# Altium footprint library pcblib.PcbLib: 92 footprints (part 2 of 6)
Each footprint in its own frame and in the unit in brackets; x right, y up, seen from the top. Pads: shape width x height; smd on the part's side, far side on the other; paste and mask are expansions set on the pad; w line width, h text height; cw(c..) or ccw(c..) is an arc to the next point about the centre after c.
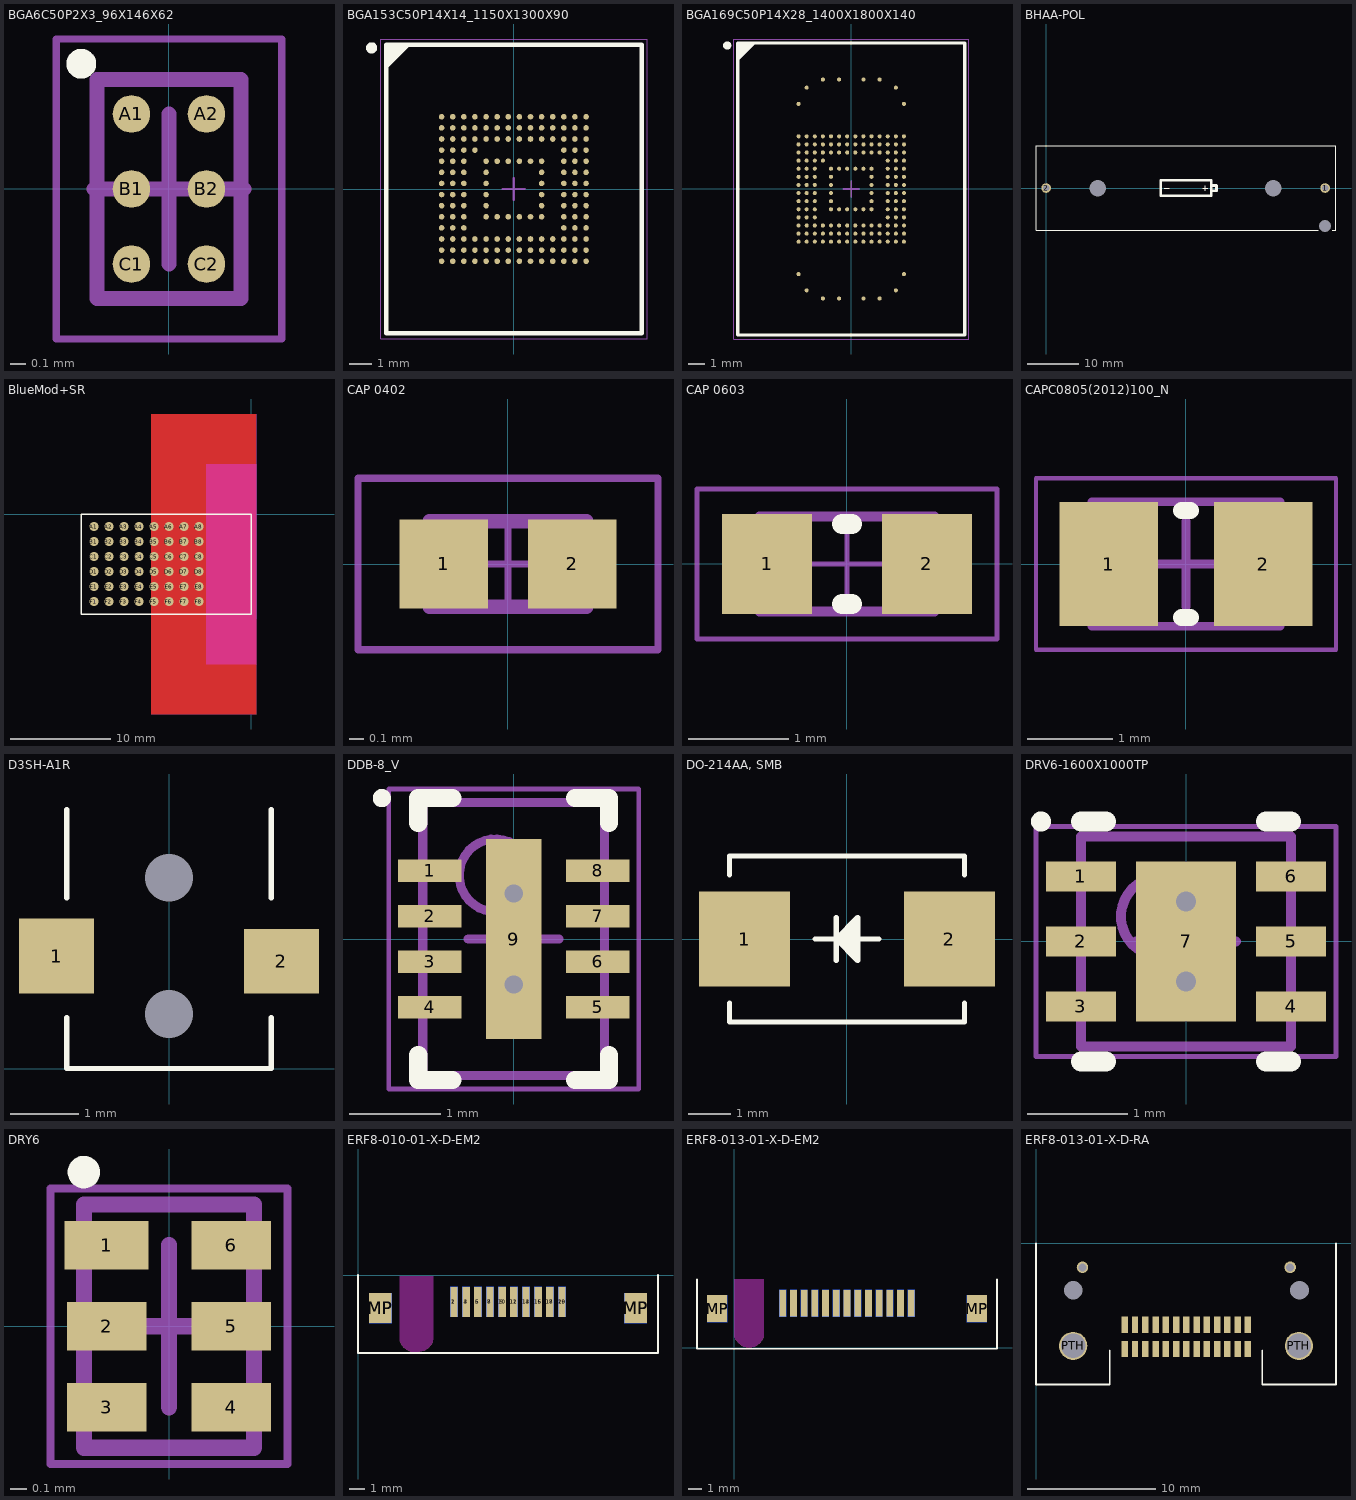
[diagram p1: the footprints below, top view; thin cyan lines are the x and y axes]

## BGA6C50P2X3_96X146X62 [mm] "BGA, 6-Leads, Body 0.96x1.46mmx0.63mm, Pitch 0.50mm"
height 0.63
pads (6):
  round 0.25 smd: A1(-0.25,0.5) A2(0.25,0.5) B1(-0.25,0) B2(0.25,0) C1(-0.25,-0.5) C2(0.25,-0.5)
Top Overlay:
  circle w0.1: c-0.585,0.835 r0.05
Mechanical 13:
  lines w0.1: -0.48,-0.73 0.48,-0.73 0.48,0.73 -0.48,0.73 -0.48,-0.73
Mechanical 15:
  lines w0.05: -0.75,-1 0.75,-1 0.75,1 -0.75,1 -0.75,-1
  lines w0.1: -0.5,0 0.5,0 ; 0,-0.5 0,0.5
3D body: height 0.63, standoff 0.25, extent -0.48,-0.73 0.48,0.73

## BGA153C50P14X14_1150X1300X90 [mm] "BGA, 153-Leads, Body 11.50x13.00mmx0.90mm, Pitch 0.50mm"
height 0.9
pads (153):
  round 0.25 smd: A1(-3.25,3.25) A2(-2.75,3.25) A3(-2.25,3.25) A4(-1.75,3.25) A5(-1.25,3.25) A6(-0.75,3.25) A7(-0.25,3.25) A8(0.25,3.25) A9(0.75,3.25) A10(1.25,3.25) A11(1.75,3.25) A12(2.25,3.25) A13(2.75,3.25) A14(3.25,3.25) B1(-3.25,2.75) B2(-2.75,2.75) B3(-2.25,2.75) B4(-1.75,2.75) B5(-1.25,2.75) B6(-0.75,2.75) B7(-0.25,2.75) B8(0.25,2.75) B9(0.75,2.75) B10(1.25,2.75) B11(1.75,2.75) B12(2.25,2.75) B13(2.75,2.75) B14(3.25,2.75) C1(-3.25,2.25) C2(-2.75,2.25) C3(-2.25,2.25) C4(-1.75,2.25) C5(-1.25,2.25) C6(-0.75,2.25) C7(-0.25,2.25) C8(0.25,2.25) C9(0.75,2.25) C10(1.25,2.25) C11(1.75,2.25) C12(2.25,2.25) C13(2.75,2.25) C14(3.25,2.25) D1(-3.25,1.75) D2(-2.75,1.75) D3(-2.25,1.75) D4(-1.75,1.75) D12(2.25,1.75) D13(2.75,1.75) D14(3.25,1.75) E1(-3.25,1.25) E2(-2.75,1.25) E3(-2.25,1.25) E5(-1.25,1.25) E6(-0.75,1.25) E7(-0.25,1.25) E8(0.25,1.25) E9(0.75,1.25) E10(1.25,1.25) E12(2.25,1.25) E13(2.75,1.25) E14(3.25,1.25) F1(-3.25,0.75) F2(-2.75,0.75) F3(-2.25,0.75) F5(-1.25,0.75) F10(1.25,0.75) F12(2.25,0.75) F13(2.75,0.75) F14(3.25,0.75) G1(-3.25,0.25) G2(-2.75,0.25) G3(-2.25,0.25) G5(-1.25,0.25) G10(1.25,0.25) G12(2.25,0.25) G13(2.75,0.25) G14(3.25,0.25) H1(-3.25,-0.25) H2(-2.75,-0.25) H3(-2.25,-0.25) H5(-1.25,-0.25) H10(1.25,-0.25) H12(2.25,-0.25) H13(2.75,-0.25) H14(3.25,-0.25) J1(-3.25,-0.75) J2(-2.75,-0.75) J3(-2.25,-0.75) J5(-1.25,-0.75) J10(1.25,-0.75) J12(2.25,-0.75) J13(2.75,-0.75) J14(3.25,-0.75) K1(-3.25,-1.25) K2(-2.75,-1.25) K3(-2.25,-1.25) K5(-1.25,-1.25) K6(-0.75,-1.25) K7(-0.25,-1.25) K8(0.25,-1.25) K9(0.75,-1.25) K10(1.25,-1.25) K12(2.25,-1.25) K13(2.75,-1.25) K14(3.25,-1.25) L1(-3.25,-1.75) L2(-2.75,-1.75) L3(-2.25,-1.75) L12(2.25,-1.75) L13(2.75,-1.75) L14(3.25,-1.75) M1(-3.25,-2.25) M2(-2.75,-2.25) M3(-2.25,-2.25) M4(-1.75,-2.25) M5(-1.25,-2.25) M6(-0.75,-2.25) M7(-0.25,-2.25) M8(0.25,-2.25) M9(0.75,-2.25) M10(1.25,-2.25) M11(1.75,-2.25) M12(2.25,-2.25) M13(2.75,-2.25) M14(3.25,-2.25) N1(-3.25,-2.75) N2(-2.75,-2.75) N3(-2.25,-2.75) N4(-1.75,-2.75) N5(-1.25,-2.75) N6(-0.75,-2.75) N7(-0.25,-2.75) N8(0.25,-2.75) N9(0.75,-2.75) N10(1.25,-2.75) N11(1.75,-2.75) N12(2.25,-2.75) N13(2.75,-2.75) N14(3.25,-2.75) P1(-3.25,-3.25) P2(-2.75,-3.25) P3(-2.25,-3.25) P4(-1.75,-3.25) P5(-1.25,-3.25) P6(-0.75,-3.25) P7(-0.25,-3.25) P8(0.25,-3.25) P9(0.75,-3.25) P10(1.25,-3.25) P11(1.75,-3.25) P12(2.25,-3.25) P13(2.75,-3.25) P14(3.25,-3.25)
Top Overlay:
  circle w0.25: c-6.4,6.35 r0.125
  region: -4.75,6.5 -5.75,5.5 -5.75,6.5
  lines w0.2: -5.75,5.5 -4.75,6.5 ; -5.75,-6.5 5.75,-6.5 5.75,6.5 -5.75,6.5 -5.75,-6.5
Mechanical 13:
  lines w0.1: -5.75,-6.5 5.75,-6.5 5.75,6.5 -5.75,6.5 -5.75,-6.5
Mechanical 15:
  lines w0.05: -6,-6.75 6,-6.75 6,6.75 -6,6.75 -6,-6.75
  lines w0.1: -0.5,0 0.5,0 ; 0,-0.5 0,0.5
3D body: height 0.9, standoff 0.22, extent -5.75,-6.5 5.75,6.5

## BGA169C50P14X28_1400X1800X140 [mm] "BGA, 169-Leads, Body 14.00x18.00mmx1.40mm, Pitch 0.50mm"
height 1.4
pads (169):
  round 0.25 smd: A4(-1.75,6.75) A6(-0.75,6.75) A9(0.75,6.75) A11(1.75,6.75) AA1(-3.25,-3.25) AA2(-2.75,-3.25) AA3(-2.25,-3.25) AA4(-1.75,-3.25) AA5(-1.25,-3.25) AA6(-0.75,-3.25) AA7(-0.25,-3.25) AA8(0.25,-3.25) AA9(0.75,-3.25) AA10(1.25,-3.25) AA11(1.75,-3.25) AA12(2.25,-3.25) AA13(2.75,-3.25) AA14(3.25,-3.25) AE1(-3.25,-5.25) AE14(3.25,-5.25) AG2(-2.75,-6.25) AG13(2.75,-6.25) AH4(-1.75,-6.75) AH6(-0.75,-6.75) AH9(0.75,-6.75) AH11(1.75,-6.75) B2(-2.75,6.25) B13(2.75,6.25) D1(-3.25,5.25) D14(3.25,5.25) H1(-3.25,3.25) H2(-2.75,3.25) H3(-2.25,3.25) H4(-1.75,3.25) H5(-1.25,3.25) H6(-0.75,3.25) H7(-0.25,3.25) H8(0.25,3.25) H9(0.75,3.25) H10(1.25,3.25) H11(1.75,3.25) H12(2.25,3.25) H13(2.75,3.25) H14(3.25,3.25) J1(-3.25,2.75) J2(-2.75,2.75) J3(-2.25,2.75) J4(-1.75,2.75) J5(-1.25,2.75) J6(-0.75,2.75) J7(-0.25,2.75) J8(0.25,2.75) J9(0.75,2.75) J10(1.25,2.75) J11(1.75,2.75) J12(2.25,2.75) J13(2.75,2.75) J14(3.25,2.75) K1(-3.25,2.25) K2(-2.75,2.25) K3(-2.25,2.25) K4(-1.75,2.25) K5(-1.25,2.25) K6(-0.75,2.25) K7(-0.25,2.25) K8(0.25,2.25) K9(0.75,2.25) K10(1.25,2.25) K11(1.75,2.25) K12(2.25,2.25) K13(2.75,2.25) K14(3.25,2.25) L1(-3.25,1.75) L2(-2.75,1.75) L3(-2.25,1.75) L4(-1.75,1.75) L12(2.25,1.75) L13(2.75,1.75) L14(3.25,1.75) M1(-3.25,1.25) M2(-2.75,1.25) M3(-2.25,1.25) M5(-1.25,1.25) M6(-0.75,1.25) M7(-0.25,1.25) M8(0.25,1.25) M9(0.75,1.25) M10(1.25,1.25) M12(2.25,1.25) M13(2.75,1.25) M14(3.25,1.25) N1(-3.25,0.75) N2(-2.75,0.75) N3(-2.25,0.75) N5(-1.25,0.75) N10(1.25,0.75) N12(2.25,0.75) N13(2.75,0.75) N14(3.25,0.75) P1(-3.25,0.25) P2(-2.75,0.25) P3(-2.25,0.25) P5(-1.25,0.25) P10(1.25,0.25) P12(2.25,0.25) P13(2.75,0.25) P14(3.25,0.25) R1(-3.25,-0.25) R2(-2.75,-0.25) R3(-2.25,-0.25) R5(-1.25,-0.25) R10(1.25,-0.25) R12(2.25,-0.25) R13(2.75,-0.25) R14(3.25,-0.25) T1(-3.25,-0.75) T2(-2.75,-0.75) T3(-2.25,-0.75) T5(-1.25,-0.75) T10(1.25,-0.75) T12(2.25,-0.75) T13(2.75,-0.75) T14(3.25,-0.75) U1(-3.25,-1.25) U2(-2.75,-1.25) U3(-2.25,-1.25) U5(-1.25,-1.25) U6(-0.75,-1.25) U7(-0.25,-1.25) U8(0.25,-1.25) U9(0.75,-1.25) U10(1.25,-1.25) U12(2.25,-1.25) U13(2.75,-1.25) U14(3.25,-1.25) V1(-3.25,-1.75) V2(-2.75,-1.75) V3(-2.25,-1.75) V12(2.25,-1.75) V13(2.75,-1.75) V14(3.25,-1.75) W1(-3.25,-2.25) W2(-2.75,-2.25) W3(-2.25,-2.25) W4(-1.75,-2.25) W5(-1.25,-2.25) W6(-0.75,-2.25) W7(-0.25,-2.25) W8(0.25,-2.25) W9(0.75,-2.25) W10(1.25,-2.25) W11(1.75,-2.25) W12(2.25,-2.25) W13(2.75,-2.25) W14(3.25,-2.25) Y1(-3.25,-2.75) Y2(-2.75,-2.75) Y3(-2.25,-2.75) Y4(-1.75,-2.75) Y5(-1.25,-2.75) Y6(-0.75,-2.75) Y7(-0.25,-2.75) Y8(0.25,-2.75) Y9(0.75,-2.75) Y10(1.25,-2.75) Y11(1.75,-2.75) Y12(2.25,-2.75) Y13(2.75,-2.75) Y14(3.25,-2.75)
Top Overlay:
  circle w0.25: c-7.65,8.85 r0.125
  region: -6,9 -7,8 -7,9
  lines w0.2: -7,8 -6,9 ; -7,-9 7,-9 7,9 -7,9 -7,-9
Mechanical 13:
  lines w0.1: -7,-9 7,-9 7,9 -7,9 -7,-9
Mechanical 15:
  lines w0.05: -7.25,-9.25 7.25,-9.25 7.25,9.25 -7.25,9.25 -7.25,-9.25
  lines w0.1: -0.5,0 0.5,0 ; 0,-0.5 0,0.5
3D body: height 1.4, standoff 0.16, extent -7,-9 7,9

## BHAA-POL [mm] "HOLDER BATT AA POLAR PROTECTION"
height 19.05
pads (5):
  round 1.9 hole 1.25: 1(54.86,0) 2(0,0)
  round 0 hole 3.25: MH(10.11,0) MH(44.65,0)
  round 0 hole 2.4: MH(54.86,-7.47)
Top Overlay:
  lines w0.2: 23.25,0 24.25,0 ; 30.75,0 31.75,0 ; 31.25,-0.5 31.25,0.5 ; 53.5,-8.3 -2,-8.3 -2,8.3 57,8.3 57,-8.3 56.25,-8.3
  lines w0.5: 32.5,-0.5 33.5,-0.5 33.5,0.5 32.5,0.5 ; 22.5,-1.5 22.5,1.5 32.5,1.5 32.5,-1.5 22.5,-1.5
3D body: height 19.81, standoff -4.57, extent -2,-8.255 56.928,8.255

## BlueMod+SR [mm] "Bluetooth Dual Mode Module with NFC Handover"
pads (48):
  round 0.9 smd: A1(-15.75,-1.25) A2(-14.25,-1.25) A3(-12.75,-1.25) A4(-11.25,-1.25) A5(-9.75,-1.25) A6(-8.25,-1.25) A7(-6.75,-1.25) A8(-5.25,-1.25) B1(-15.75,-2.75) B2(-14.25,-2.75) B3(-12.75,-2.75) B4(-11.25,-2.75) B5(-9.75,-2.75) B6(-8.25,-2.75) B7(-6.75,-2.75) B8(-5.25,-2.75) C1(-15.75,-4.25) C2(-14.25,-4.25) C3(-12.75,-4.25) C4(-11.25,-4.25) C5(-9.75,-4.25) C6(-8.25,-4.25) C7(-6.75,-4.25) C8(-5.25,-4.25) D1(-15.75,-5.75) D2(-14.25,-5.75) D3(-12.75,-5.75) D4(-11.25,-5.75) D5(-9.75,-5.75) D6(-8.25,-5.75) D7(-6.75,-5.75) D8(-5.25,-5.75) E1(-15.75,-7.25) E2(-14.25,-7.25) E3(-12.75,-7.25) E4(-11.25,-7.25) E5(-9.75,-7.25) E6(-8.25,-7.25) E7(-6.75,-7.25) E8(-5.25,-7.25) F1(-15.75,-8.75) F2(-14.25,-8.75) F3(-12.75,-8.75) F4(-11.25,-8.75) F5(-9.75,-8.75) F6(-8.25,-8.75) F7(-6.75,-8.75) F8(-5.25,-8.75)
Top Layer:
  pour cut-out: 0.5,10 -10,10 -10,-10.5 0.5,-10.5
  pour cut-out: 0.5,0.5 -10,0.5 -10,-20 0.5,-20
Bottom Layer:
  pour cut-out: 0.5,0.5 -10,0.5 -10,-20 0.5,-20
  pour cut-out: 0.5,10 -10,10 -10,-10.5 0.5,-10.5
Top Overlay:
  lines w0.127: -17,-10 -17,0 0,0 0,-10 -17,-10
Keep-Out Layer:
  pour cut-out: 0.5,5 -4.5,5 -4.5,-10.5 0.5,-10.5
  pour cut-out: 0.5,0.5 -4.5,0.5 -4.5,-15 0.5,-15
3D body: height 2.7, standoff 0, extent -17,-10 0,0

## CAP 0402 [mm] "Chip Capacitor, Body 1.0x0.5mm, Height 0.6mm, IPC Medium Density"
height 0.6
pads (2):
  rect 0.62x0.62 smd: 1(-0.45,0) 2(0.45,0)
Mechanical 13:
  lines w0.1: -0.55,-0.3 0.55,-0.3 0.55,0.3 -0.55,0.3 -0.55,-0.3
Mechanical 15:
  lines w0.05: -0.3,0 0.3,0 ; 0,-0.3 0,0.3 ; -1.05,-0.6 1.05,-0.6 1.05,0.6 -1.05,0.6 -1.05,-0.6
3D body: height 0.6, standoff 0, extent 0.3,-0.3 0.55,0.3
3D body: height 0.6, standoff 0, extent -0.55,-0.3 -0.3,0.3
3D body: height 0.6, standoff 0, extent -0.3,-0.3 0.3,0.3

## CAP 0603 [mm] "Chip Capacitor, Body 1.0x0.5mm, Height 0.55mm, IPC Medium Density"
height 0.55
pads (2):
  rect 0.9x1 smd: 1(-0.8,0) 2(0.8,0)
Top Overlay:
  lines w0.2: -0.05,-0.4 0.05,-0.4 ; -0.05,0.4 0.05,0.4
Mechanical 13:
  lines w0.1: -0.875,-0.475 -0.875,0.475 0.875,0.475 0.875,-0.475 -0.875,-0.475
Mechanical 15:
  lines w0.05: -0.475,0 0.475,0 ; 0,-0.475 0,0.475 ; -1.5,-0.75 -1.5,0.75 1.5,0.75 1.5,-0.75 -1.5,-0.75
3D body: height 0.55, standoff 0, extent -0.525,-0.475 0.525,0.475
3D body: height 0.55, standoff 0, extent -0.875,-0.475 -0.525,0.475
3D body: height 0.55, standoff 0, extent 0.525,-0.475 0.875,0.475

## CAPC0805(2012)100_N [mm] "Chip Capacitor, Body 2.0x1.2mm, Height 1.0mm, IPC Medium Density"
height 1
pads (2):
  rect 1.15x1.45 smd: 1(-0.9,0) 2(0.9,0)
Top Overlay:
  lines w0.2: -0.05,-0.625 0.05,-0.625 ; -0.05,0.625 0.05,0.625
Mechanical 13:
  lines w0.1: -1.1,-0.725 1.1,-0.725 1.1,0.725 -1.1,0.725 -1.1,-0.725
Mechanical 15:
  lines w0.05: -1.75,-1 1.75,-1 1.75,1 -1.75,1 -1.75,-1
  lines w0.1: -0.5,0 0.5,0 ; 0,-0.5 0,0.5
3D body: height 1, standoff 0, extent 0.6,-0.725 1.1,0.725
3D body: height 1, standoff 0, extent -1.1,-0.725 -0.6,0.725
3D body: height 1, standoff 0, extent -0.6,-0.725 0.6,0.725

## D3SH-A1R [mm] "SWITCH SPST-NO RT W/BOSS 30V"
pads (4):
  rect 1.1x1.1 smd: 1(-1.65,1.65)
  rect 1.1x0.95 smd: 2(1.65,1.575)
  round 0 hole 0.7: MH(0,0.8) MH(0,2.8)
Top Overlay:
  lines w0.076: -1.5,0.75 -1.5,0 1.5,0 1.5,0.75 ; -1.5,2.5 -1.5,3.8 ; 1.5,2.5 1.5,3.8
3D body: height 0.9, standoff -0.4, extent -1.89,0 1.89,5

## DDB-8_V [mm] "SON, 8-Leads, Body 3x2mm, Pitch 0.5mm, Thermal Pad 2.2x0.61mm"
height 0.8
pads (9):
  rect 0.7x0.25 smd mask+0.102: 1(-0.925,0.75) 2(-0.925,0.25) 3(-0.925,-0.25) 4(-0.925,-0.75) 5(0.925,-0.75) 6(0.925,-0.25) 7(0.925,0.25) 8(0.925,0.75)
  rect 0.61x2.2 smd mask+0.102: 9(0,0)
via 0,0.5 diameter 0.5 hole 0.2
via 0,-0.5 diameter 0.5 hole 0.2
Top Overlay:
  circle w0.1: c-1.45,1.55 r0.05
  lines w0.2: -1.05,-1.275 -1.05,-1.55 -0.675,-1.55 ; -1.05,1.275 -1.05,1.55 -0.675,1.55 ; 0.675,-1.55 1.05,-1.55 1.05,-1.275 ; 0.675,1.55 1.05,1.55 1.05,1.275
Mechanical 13:
  circle w0.1: c-0.2,0.7 r0.4
  lines w0.1: -1,-1.5 -1,1.5 1,1.5 1,-1.5 -1,-1.5
Mechanical 15:
  lines w0.05: -1.375,-1.65 -1.375,1.65 1.375,1.65 1.375,-1.65 -1.375,-1.65
  lines w0.1: -0.5,0 0.5,0 ; 0,-0.5 0,0.5
3D body: height 0.8, standoff 0, extent -1,-1.5 1,1.5

## DO-214AA, SMB [mil] "DO-214AA (SMB J-Bend)"
pads (2):
  rect 85x89 smd: 1(-96,0) 2(96,0)
Top Overlay:
  region: -10,0 10,20 10,-20
  lines w5: -110,60 -110,77.75 ; -30,0 30,0 ; -10,-20 -10,20 ; 110,-60 110,-77.74 ; 110.01,60 110.01,77.76 -109.99,77.76 ; -110,-60 -109.99,-60.01 ; -109.99,-60.01 -109.99,-77.74 109.99,-77.74 ; -110,77.75 -109.99,77.76 ; 109.99,-77.74 110,-77.74 ; -10,0 10,20 10,-20 -10,0
3D body: height 103, standoff -1, extent -109.99,-77.74 110.01,77.76

## DRV6-1600X1000TP [mm] "SON, 6-Leads, Body 2x2mm, Pitch 0.65mm, Thermal Pad 1.6x1mm, TI Recommended"
height 0.8
pads (7):
  rect 0.7x0.3 smd paste-0.025 mask+0.07: 1(-1.05,0.65) 2(-1.05,0) 3(-1.05,-0.65) 4(1.05,-0.65) 5(1.05,0) 6(1.05,0.65)
  rect 1x1.6 smd paste-0.5 mask+0.07: 7(0,0)
via 0,0.4 diameter 0.5 hole 0.2
via 0,-0.4 diameter 0.5 hole 0.2
Top Overlay:
  circle w0.1: c-1.45,1.2 r0.05
  lines w0.2: -1.05,-1.2 -0.8,-1.2 ; -1.05,1.2 -0.8,1.2 ; 0.8,-1.2 1.05,-1.2 ; 0.8,1.2 1.05,1.2
Top Paste:
  rectangle: -0.4,-0.7 0.4,0.7
Mechanical 13:
  circle w0.1: c-0.25,0.25 r0.4
  lines w0.1: -1.05,-1.05 -1.05,1.05 1.05,1.05 1.05,-1.05 -1.05,-1.05
Mechanical 15:
  lines w0.05: -1.5,-1.15 -1.5,1.15 1.5,1.15 1.5,-1.15 -1.5,-1.15
  lines w0.1: -0.5,0 0.5,0 ; 0,-0.5 0,0.5
3D body: height 0.8, standoff 0, extent -1.05,-1.05 1.05,1.05

## DRY6 [mm] "PSON, 6-Leads, Body 1x1.45mm, Pitch 0.5mm, TI Recommended"
height 0.6
pads (6):
  rect 0.52x0.3 smd paste+0 mask+0.05: 1(-0.385,0.5)
  rect 0.49x0.3 smd paste+0 mask+0.05: 2(-0.385,0) 3(-0.385,-0.5) 4(0.385,-0.5) 5(0.385,0) 6(0.385,0.5)
Top Overlay:
  circle w0.1: c-0.525,0.95 r0.05
Mechanical 13:
  lines w0.1: -0.525,-0.75 0.525,-0.75 0.525,0.75 -0.525,0.75 -0.525,-0.75
Mechanical 15:
  lines w0.05: -0.73,-0.85 0.73,-0.85 0.73,0.85 -0.73,0.85 -0.73,-0.85
  lines w0.1: -0.5,0 0.5,0 ; 0,-0.5 0,0.5
3D body: height 0.6, standoff 0, extent -0.525,-0.75 0.525,0.75

## ERF8-010-01-X-D-EM2 [mm] "0,80 mm Edge Rate® Rugged High Speed Socket Strip, Edge Mount"
pads (24):
  rect 0.5x2 smd: 1(6.4,-1.8) 3(7.2,-1.8) 5(8,-1.8) 7(8.8,-1.8) 9(9.6,-1.8) 11(10.4,-1.8) 13(11.2,-1.8) 15(12,-1.8) 17(12.8,-1.8) 19(13.6,-1.8)
  rect 0.5x2 smd far side: 2(6.4,-1.8) 4(7.2,-1.8) 6(8,-1.8) 8(8.8,-1.8) 10(9.6,-1.8) 12(10.4,-1.8) 14(11.2,-1.8) 16(12,-1.8) 18(12.8,-1.8) 20(13.6,-1.8)
  rect 1.5x2 smd: MP(1.5,-2.2) MP(18.5,-2.2)
  rect 1.5x2 smd far side: MP(1.5,-2.2) MP(18.5,-2.2)
Top Overlay:
  lines w0.127: 0,0 0,-5.2 20,-5.2 20,0
Keep-Out Layer:
  board cut-out: 2.78,-0.09 2.78,-4.387 2.896,-4.616 3.048,-4.844 3.251,-4.997 3.508,-5.116 4.094,-5.116 4.42,-5.048 4.699,-4.895 4.902,-4.616 4.978,-4.463 5,-4.209 5,-0.09
3D body: height 2, standoff -3.6, extent 0,-5.2 20,7

## ERF8-013-01-X-D-EM2 [mm] "0,80 mm Edge Rate® Rugged High Speed Socket Strip, Edge Mount"
pads (30):
  rect 0.5x2 smd: 1(3.62,3.31) 3(4.42,3.31) 5(5.22,3.31) 7(6.02,3.31) 9(6.82,3.31) 11(7.62,3.31) 13(8.42,3.31) 15(9.22,3.31) 17(10.02,3.31) 19(10.82,3.31) 21(11.62,3.31) 23(12.42,3.31) 25(13.22,3.31)
  rect 0.5x2 smd far side: 2(3.62,3.31) 4(4.42,3.31) 6(5.22,3.31) 8(6.02,3.31) 10(6.82,3.31) 12(7.62,3.31) 14(8.42,3.31) 16(9.22,3.31) 18(10.02,3.31) 20(10.82,3.31) 22(11.62,3.31) 24(12.42,3.31) 26(13.22,3.31)
  rect 1.5x2 smd: MP(-1.28,2.91) MP(18.12,2.91)
  rect 1.5x2 smd far side: MP(-1.28,2.91) MP(18.12,2.91)
Top Overlay:
  lines w0.127: -2.78,5.11 -2.78,-0.09 19.62,-0.09 19.62,5.11
Keep-Out Layer:
  board cut-out: 0,5.11 0,0.787 0.076,0.635 0.178,0.508 0.33,0.33 0.508,0.178 0.686,0.076 0.889,0.025 1.11,0 1.346,0.025 1.549,0.076 1.727,0.178 1.905,0.33 2.057,0.508 2.22,0.787 2.22,5.11
3D body: height 2.8, standoff -2.8, extent -2.78,-0.09 19.62,12.11

## ERF8-013-01-X-D-RA [mm] "0,80 mm Edge Rate® Rugged High Speed Socket Strip, Right Angle"
pads (32):
  rect 0.5x1.25 smd: 1(16.525,-6.338) 2(16.525,-8.218) 3(15.725,-6.338) 4(15.725,-8.218) 5(14.925,-6.338) 6(14.925,-8.218) 7(14.125,-6.338) 8(14.125,-8.218) 9(13.325,-6.338) 10(13.325,-8.218) 11(12.525,-6.338) 12(12.525,-8.218) 13(11.725,-6.338) 14(11.725,-8.218) 15(10.925,-6.338) 16(10.925,-8.218) 17(10.125,-6.338) 18(10.125,-8.218) 19(9.325,-6.338) 20(9.325,-8.218) 21(8.525,-6.338) 22(8.525,-8.218) 23(7.725,-6.338) 24(7.725,-8.218) 25(6.925,-6.338) 26(6.925,-8.218)
  round 0 hole 1.45 unplated: NPTH(2.9,-3.638) NPTH(20.55,-3.638)
  round 2.2 hole 1.905: PTH(2.9,-7.988) PTH(20.508,-7.988)
  round 0.9 hole 0.63: PTH(3.625,-1.858) PTH(19.825,-1.858)
Top Overlay:
  lines w0.127: 0,0 0,-11 5.75,-11 5.75,-8.35 ; 17.65,-8.35 17.65,-11 23.4,-11 23.4,0
3D body: height 6.35, standoff -1.45, extent 0,-11 23.4,0.35